# Altium footprint library pcb.PcbLib: 397 footprints (part 17 of 25)
Each footprint in its own frame and in the unit in brackets; x right, y up, seen from the top. Pads: shape width x height; smd on the part's side, far side on the other; paste and mask are expansions set on the pad; w line width, h text height; cw(c..) or ccw(c..) is an arc to the next point about the centre after c.
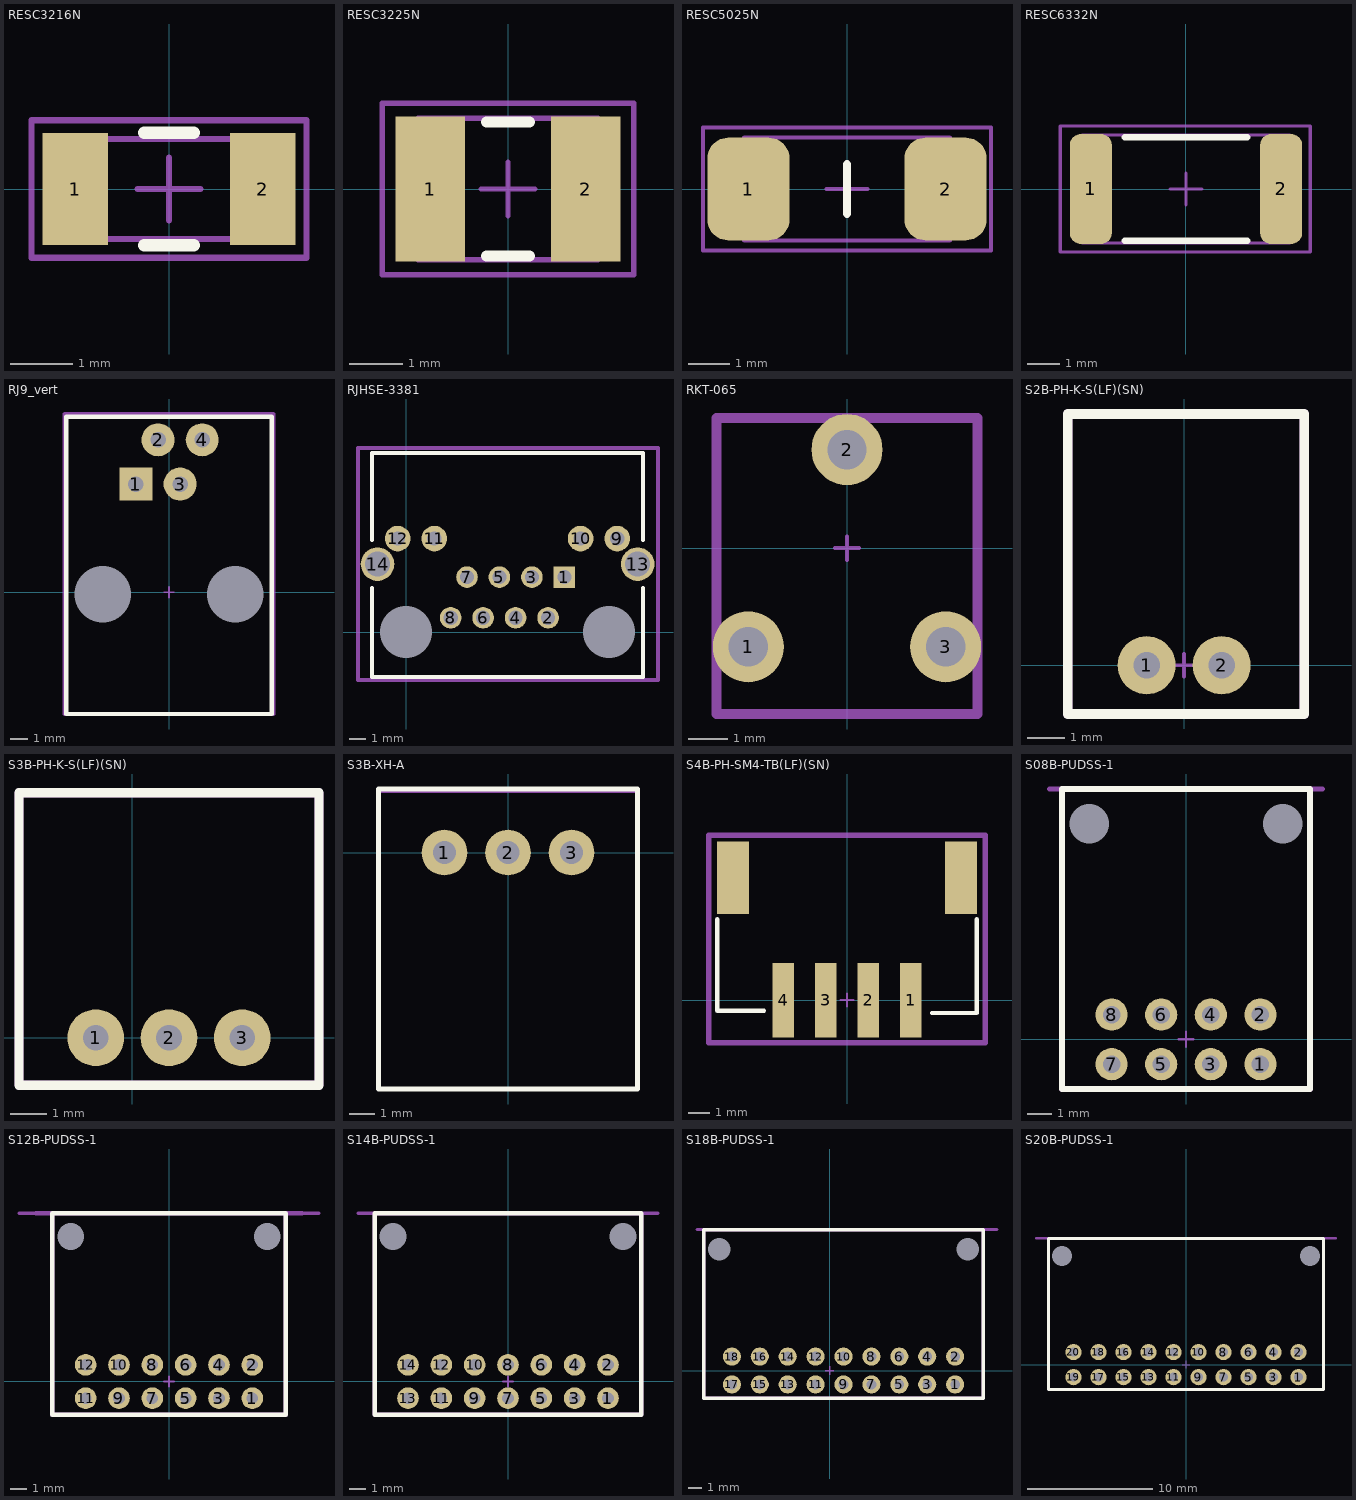
[diagram p16: the footprints below, top view; thin cyan lines are the x and y axes]

## RESC3216N [mm] "1206; Resistor,Chip;3.15mm L X 1.60mm W X 0.60mm H"
height 0.71
pads (2):
  rect 1.05x1.8 smd: 1(-1.5,0) 2(1.5,0)
Top Overlay:
  lines w0.2: -0.4,-0.9 0.4,-0.9 ; -0.4,0.9 0.4,0.9
Mechanical 13:
  lines w0.1: -1.6,-0.8 1.675,-0.8 1.675,0.8 -1.6,0.8 -1.6,-0.8
Mechanical 15:
  lines w0.1: -0.5,0 0.5,0 ; 0,-0.5 0,0.5 ; -2.2,-1.1 2.2,-1.1 2.2,1.1 -2.2,1.1 -2.2,-1.1
  text ".Designator" at -1.9,-0.8 h0.51
3D body: height 0.71, standoff 0, extent -1.6,-0.8 1.6,0.8

## RESC3225N [mm] "Chip Resistor, Body 3.2x2.5mm, IPC Medium Density"
height 0.71
pads (2):
  rect 1.3x2.7 smd: 1(-1.45,0) 2(1.45,0)
Top Overlay:
  lines w0.2: -0.4,-1.25 0.4,-1.25 ; -0.4,1.25 0.4,1.25
Mechanical 13:
  lines w0.1: -1.675,-1.32 -1.675,1.32 1.675,1.32 1.675,-1.32 -1.675,-1.32
Mechanical 15:
  lines w0.1: -0.5,0 0.5,0 ; 0,-0.5 0,0.5 ; -2.35,-1.6 -2.35,1.6 2.35,1.6 2.35,-1.6 -2.35,-1.6
  text ".Designator" at -1.88,-1.067 h0.51
3D body: height 0.71, standoff 0, extent -1.675,-1.32 1.675,1.32

## RESC5025N [mm]
pads (2):
  rrect50% 2x2.5 smd: 1(-2.4,0) 2(2.4,0)
Top Overlay:
  lines w0.2: 0,-0.6 0,0.6
Mechanical 13:
  lines w0.1: -2.5,-1.25 -2.5,1.25 2.5,1.25 2.5,-1.25 -2.5,-1.25
Mechanical 15:
  lines w0.1: -0.5,0 0.5,0 ; 0,-0.5 0,0.5 ; -3.5,-1.5 3.5,-1.5 3.5,1.5 -3.5,1.5 -3.5,-1.5
  text ".Designator" at -2.5,-1.5 h0.51
3D body: height 0.55, standoff 0, extent -2.5,-1.25 2.5,1.25

## RESC6332N [mm] "Chip Resistor, Body 6.3x3.2mm, IPC Medium Density"
height 0.71
pads (2):
  rrect50% 1.3x3.4 smd: 1(-2.95,0) 2(2.95,0)
Top Overlay:
  lines w0.2: -1.9,-1.6 1.9,-1.6 ; -1.9,1.6 1.9,1.6
Mechanical 13:
  lines w0.1: -3.225,-1.675 3.225,-1.675 3.225,1.675 -3.225,1.675 -3.225,-1.675
Mechanical 15:
  lines w0.1: -0.5,0 0.5,0 ; 0,-0.5 0,0.5 ; -3.9,-1.95 3.85,-1.95 3.85,1.95 -3.9,1.95 -3.9,-1.95
  text ".Designator" at -2.58,-1.267 h0.51
3D body: height 0.71, standoff 0, extent -3.225,-1.675 3.225,1.675

## RJ9_vert [mm]
height 2.38
pads (6):
  rect 1.9x1.9 hole 0.89: 1(-1.9,6.223)
  round 1.9 hole 0.89: 2(-0.63,8.763) 3(0.64,6.223) 4(1.91,8.763)
  round 0 hole 3.25 unplated: ""(-3.81,-0.127) ""(3.81,-0.127)
Top Overlay:
  lines w0.254: -5.9,-7 5.9,-7 5.9,10.1 -5.9,10.1 -5.9,-7
Mechanical 15:
  lines w0.1: -0.3,0 0.3,0 ; 0,-0.3 0,0.3
  lines w0.254: -6,-7 6,-7 6,10.25 -6,10.25 -6,-7
  text ".Designator" at -2.5,2.5 h1.02
3D body "c-5558872-01-b-3d.stp": height 17, standoff -2.81, extent -5.7,-6.855 5.73,9.655

## RJHSE-3381 [mm]
height 2.38
pads (16):
  rect 1.35x1.35 hole 0.89: 1(9.9,3.43)
  round 1.35 hole 0.89: 2(8.88,0.89) 3(7.87,3.43) 4(6.85,0.89) 5(5.84,3.43) 6(4.82,0.89) 7(3.81,3.43) 8(2.79,0.89)
  round 1.6 hole 0.89: 9(13.2,5.84) 10(10.91,5.84) 11(1.77,5.84) 12(-0.52,5.84)
  round 2.1 hole 1.57: 13(14.48,4.24) 14(-1.78,4.24)
  round 0 hole 3.25 unplated: ""(0,0) ""(12.7,0)
Top Overlay:
  lines w0.254: -2.125,2.75 -2.125,-2.8 14.8,-2.8 14.8,2.75 ; -2.125,5.75 -2.125,11.2 14.8,11.2 14.8,5.75
Mechanical 15:
  lines w0.1: -0.3,0 0.3,0 ; 0,-0.3 0,0.3
  lines w0.254: -3,-3 15.75,-3 15.75,11.5 -3,11.5 -3,-3
  text ".Designator" at 0.5,9.75 h1.02
3D body: height 16, standoff 0, extent -1.9,-2.6 14.6,11
3D body: height 10.5, standoff 9.5, extent -2.9,-2.6 -1.9,11
3D body: height 10.5, standoff 9.5, extent 14.6,-2.6 15.6,11

## RKT-065 [mm]
height 7.6
pads (3):
  round 1.8 hole 1: 1(-2.5,-2.5) 2(0,2.5) 3(2.5,-2.5)
Mechanical 15:
  lines w0.1: -0.3,0 0.3,0 ; 0,-0.3 0,0.3
  lines w0.254: -3.3,-4.2 3.3,-4.2 3.3,3.3 -3.3,3.3 -3.3,-4.2
  text ".Designator" at -4.572,-2.286 h1.02
3D body: height 7.6, standoff 0, extent -3.3,-4.3 3.3,3.3

## S2B-PH-K-S(LF)(SN) [mm]
height 2.38
pads (2):
  round 1.55 hole 0.7: 1(-1,0) 2(1,0)
Top Overlay:
  lines w0.254: -3.1,-1.3 3.2,-1.3 3.2,6.7 -3.1,6.7 -3.1,-1.3
Mechanical 15:
  lines w0.1: -0.3,0 0.3,0 ; 0,-0.3 0,0.3
  lines w0.254: -3.1,-1.3 3.2,-1.3 3.2,6.7 -3.1,6.7 -3.1,-1.3
  text ".Designator" at -2.3,1.4 h1.02
3D body "S2B-PH-K-S.STEP": height 4.8, standoff -3.4, extent -2.9,-1.1 3,6.5

## S3B-PH-K-S(LF)(SN) [mm]
height 2.38
pads (3):
  round 1.55 hole 0.7: 1(-1,0) 2(1,0) 3(3,0)
Top Overlay:
  lines w0.254: -3.1,-1.3 -3.1,6.7 5.1,6.7 5.1,-1.3 -3.1,-1.3
Mechanical 15:
  lines w0.1: 0.7,0 1.3,0 ; 1,-0.3 1,0.3
  lines w0.254: -3.1,-1.3 -3.1,6.7 5.1,6.7 5.1,-1.3 -3.1,-1.3
  text ".Designator" at -2.3,1.4 h1.02
3D body "S3B-PH-K-S.STEP": height 4.8, standoff -3.4, extent -2.95,-1.3 4.95,6.3

## S3B-XH-A [mm]
height 6.1
pads (3):
  round 1.8 hole 0.9: 1(-2.5,0) 2(0,0) 3(2.5,0)
Top Overlay:
  lines w0.2: -5.1,-9.3 5.1,-9.3 5.1,2.5 -5.1,2.5 -5.1,-9.3
Mechanical 15:
  lines w0.1: -0.3,0 0.3,0 ; 0,-0.3 0,0.3 ; -5.1,-9.3 -5.1,2.4 5.1,2.4 5.1,-9.3 -5.1,-9.3
  text ".Designator" at -4.8,-8.9 h1.02
3D body "S3B-XH-A.STEP": height 6.15, standoff -3.4, extent -4.95,-9.2 4.95,2.3

## S4B-PH-SM4-TB(LF)(SN) [mm]
height 2.38
pads (6):
  rect 1x3.5 smd: 1(3,0) 2(1,0) 3(-1,0) 4(-3,0)
  rect 1.5x3.4 smd: ""(-5.35,5.75) ""(5.35,5.75)
Top Overlay:
  lines w0.2: -6.1,3.8 -6.1,-0.5 -3.9,-0.5 ; 4,-0.6 6.1,-0.6 6.1,3.8
Mechanical 15:
  lines w0.1: -0.3,0 0.3,0 ; 0,-0.3 0,0.3
  lines w0.254: -6.5,-2 6.5,-2 6.5,7.75 -6.5,7.75 -6.5,-2
  text "pcb_edge" at 3.75,9 h1.02
  text ".Designator" at -5,5.75 h1.02
3D body "S4B-PH-SM4-TB.STEP": height 5.5, standoff -0.1, extent -5.95,-1.3 5.95,7.3

## S08B-PUDSS-1 [mm]
height 8.5
pads (10):
  round 1.3 hole 0.7: 1(3,-1) 2(3,1) 3(1,-1) 4(1,1) 5(-1,-1) 6(-1,1) 7(-3,-1) 8(-3,1)
  round 0 hole 1.6 unplated: H1(3.9,8.7) H2(-3.9,8.7)
Top Overlay:
  lines w0.254: -5,-2 5,-2 5,10.1 -5,10.1 -5,-2
Mechanical 15:
  lines w0.1: -0.3,0 0.3,0 ; 0,-0.3 0,0.3
  lines w0.2: -5.5,10.1 -5,10.1 ; 5,10.1 5.5,10.1
  lines w0.254: -5,-2 5,-2 5,10.1 -5,10.1 -5,-2
  text "pcb_edge" at 4.1,11.1 h1.02
  text ".Designator" at -2.8,2.7 h1.02
3D body "S08B-PUDSS-1.STEP": height 8.5, standoff -3, extent -5,-1.6 5,11.1

## S12B-PUDSS-1 [mm]
height 8.5
pads (14):
  round 1.3 hole 0.7: 1(5,-1) 2(5,1) 3(3,-1) 4(3,1) 5(1,-1) 6(1,1) 7(-1,-1) 8(-1,1) 9(-3,-1) 10(-3,1) 11(-5,-1) 12(-5,1)
  round 0 hole 1.6 unplated: H1(5.9,8.7) H2(-5.9,8.7)
Top Overlay:
  lines w0.254: -7,-2 -7,10.1 7,10.1 7,-2 -7,-2
Mechanical 15:
  lines w0.1: -0.3,0 0.3,0 ; 0,-0.3 0,0.3
  lines w0.2: -9,10.1 -7,10.1 ; 7,10.1 9,10.1
  lines w0.254: -8,10.1 8,10.1 ; -7,10.1 -7,-2 7,-2 7,10.1
  text ".Designator" at -2.8,2.7 h1.02
  text "pcb_edge" at 4.1,11.1 h1.02
3D body "S12B-PUDSS-1.STEP": height 8.5, standoff -3, extent -7,-1.6 7,11.1

## S14B-PUDSS-1 [mm]
height 8.5
pads (16):
  round 1.3 hole 0.7: 1(6,-1) 2(6,1) 3(4,-1) 4(4,1) 5(2,-1) 6(2,1) 7(0,-1) 8(0,1) 9(-2,-1) 10(-2,1) 11(-4,-1) 12(-4,1) 13(-6,-1) 14(-6,1)
  round 0 hole 1.6 unplated: H1(6.9,8.7) H2(-6.9,8.7)
Top Overlay:
  lines w0.254: -8,-2 8,-2 8,10.1 -8,10.1 -8,-2
Mechanical 15:
  lines w0.1: -0.3,0 0.3,0 ; 0,-0.3 0,0.3
  lines w0.2: -9,10.1 -8,10.1 ; 8,10.1 9,10.1
  lines w0.254: -8,-2 8,-2 8,10.1 -8,10.1 -8,-2
  text "pcb_edge" at 4.1,11.1 h1.02
  text ".Designator" at -2.8,2.7 h1.02
3D body "S14B-PUDSS-1.STEP": height 8.5, standoff -3, extent -8,-1.6 8,11.1

## S18B-PUDSS-1 [mm]
height 8.5
pads (20):
  round 1.3 hole 0.7: 1(9,-1) 2(9,1) 3(7,-1) 4(7,1) 5(5,-1) 6(5,1) 7(3,-1) 8(3,1) 9(1,-1) 10(1,1) 11(-1,-1) 12(-1,1) 13(-3,-1) 14(-3,1) 15(-5,-1) 16(-5,1) 17(-7,-1) 18(-7,1)
  round 0 hole 1.6 unplated: H1(9.9,8.7) H2(-7.9,8.7)
Top Overlay:
  lines w0.254: -9,-2 11,-2 11,10.1 -9,10.1 -9,-2
Mechanical 15:
  lines w0.1: -0.3,0 0.3,0 ; 0,-0.3 0,0.3
  lines w0.2: -9.5,10.1 -9,10.1 ; 11,10.1 12,10.1
  lines w0.254: -9,-2 11,-2 11,10.1 -9,10.1 -9,-2
  text "pcb_edge" at 4.1,11.1 h1.02
  text ".Designator" at -2.8,2.7 h1.02
3D body "S18B-PUDSS-1.STEP": height 8.5, standoff -3, extent -9,-1.6 11,11.1

## S20B-PUDSS-1 [mm]
height 8.5
pads (22):
  round 1.3 hole 0.7: 1(9,-1) 2(9,1) 3(7,-1) 4(7,1) 5(5,-1) 6(5,1) 7(3,-1) 8(3,1) 9(1,-1) 10(1,1) 11(-1,-1) 12(-1,1) 13(-3,-1) 14(-3,1) 15(-5,-1) 16(-5,1) 17(-7,-1) 18(-7,1) 19(-9,-1) 20(-9,1)
  round 0 hole 1.6 unplated: H1(9.9,8.7) H2(-9.9,8.7)
Top Overlay:
  lines w0.254: -11,-2 -11,10.1 11,10.1 11,-2 -11,-2
Mechanical 15:
  lines w0.1: -0.3,0 0.3,0 ; 0,-0.3 0,0.3
  lines w0.2: -12,10.1 -11,10.1 ; 11,10.1 12,10.1
  lines w0.254: -11,-2 -11,10.1 11,10.1 11,-2 -11,-2
  text ".Designator" at -2.8,2.7 h1.02
  text "pcb_edge" at 4.1,11.1 h1.02
3D body "S20B-PUDSS-1.STEP": height 8.5, standoff -3, extent -11,-1.6 11,11.1